# Altium schematic symbol library LUCHADOR SCHLIB.SchLib: 63 symbols
Pins are listed as number, name and electrical type; pins without a type are passive.

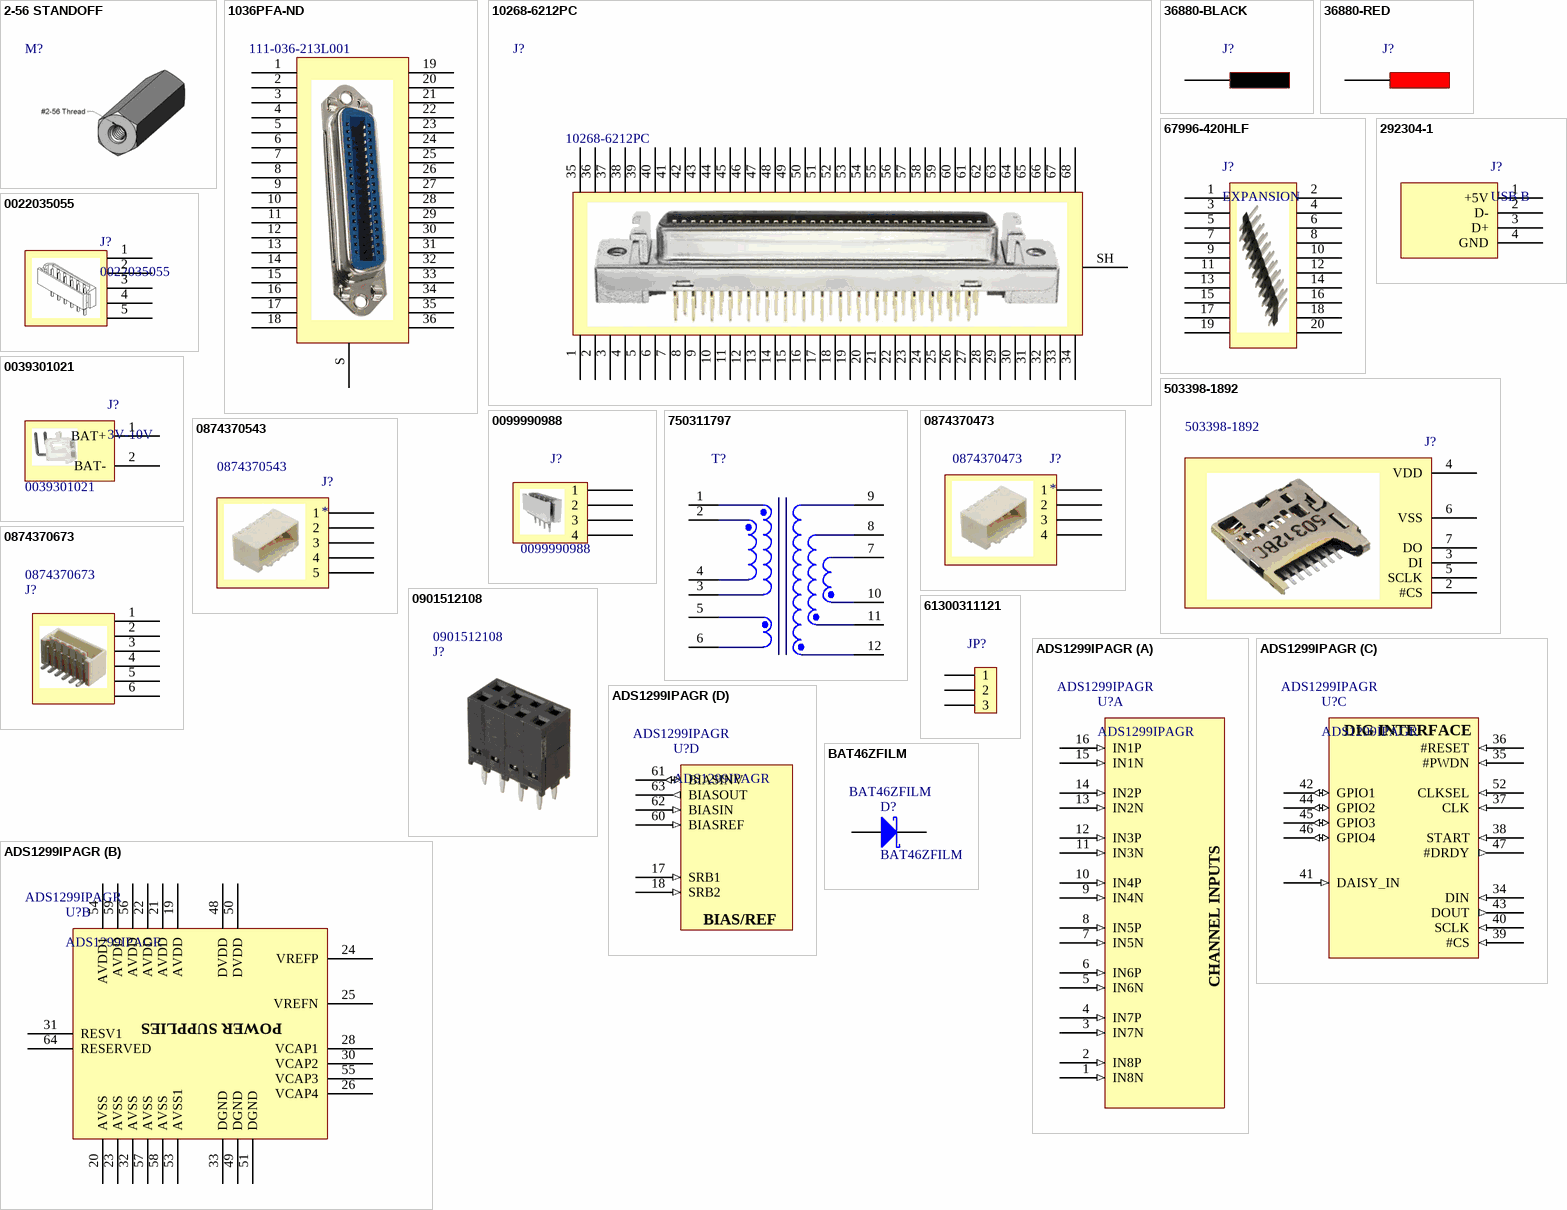
[diagram p0: symbols 2-56 STANDOFF to BAT46ZFILM]

## 2-56 STANDOFF
designator M?  (value not drawn)  (mechanical)
MANUFACTURER: MCMASTER-CARR; MANUFACTURER PART NUMBER: 91780A111; DESCRIPTION1: ALUMINUM STANDOFF, 5/8, 2-56; SUPPLIER 1: MCMASTER-CARR; SUPPLIER PART NUMBER 1: 91780A111

## 1036PFA-ND
designator J?  Manufacturer Part Number: 111-036-213L001  (hidden comment: *)
Manufacturer: NorComp Inc.; Description1: CONN SCSI .085" FEMALE PCB 36POS; Connector Style: Outer Shroud Contacts; Connector Type: Receptacle; Number of Positions: 36; Flange Feature: Hollow, Unthreaded; Supplier 1: Digi-Key; Supplier Part Number 1: 1036PFA-ND; RoHS: RoHS Compliant; Category: Connectors, Interconnects; Stock 1: 330; Pricing 1: 1=5.03, 10=4.824, 25=4.422, 50=4.221, 100=4.02, 250=3.51752, 500=3.417, 1000=2.9145, 2500=2.7135 (USD); Part Status: Active; Mounting Type: Through Hole; Termination: Solder; Type: SCSI; Features: Bail Lock; Contact Finish: Gold; Contact Finish Thickness: Flash; ComponentLink1URL: https://www.norcomp.net/rohspdfs/SCSI-050Ribbon/11Y/111/111-YYY-213L001.pdf; ComponentLink1Description: https://www.norcomp.net/rohspdfs/SCSI-050Ribbon/11Y/111/111-YYY-213L001.pdf
footprint 1036PFA-ND (Footprint not found)
pins: 1, 2, 3, 4, 5, 6, 7, 8, 9, 10, 11, 12, 13, 14, 15, 16, 17, 18, 19, 20, 21, 22, 23, 24, 25, 26, 27, 28, 29, 30, 31, 32, 33, 34, 35, 36, S

## 10268-6212PC
designator J?  Manufacturer Part Number: 10268-6212PC  (hidden comment: *)
Manufacturer: 3M; Description1: CONN MDR RECPT 68POS VERT T/H; Other Related Documents: MDR Selection Guide; Product Training Modules: Input/Output Connector Systems Primer Mini Delta Ribbon Connector System; Catalog Drawings: 102xx-6212PC Series; Featured Product: MDR Connectors; Connector Style: Outer Shroud Contacts; Connector Type: Receptacle; Number of Positions: 68; Flange Feature: Insert, Threaded (M2.5); Latchblocks; Online Catalog: 102, Mini D Ribbon (MDR) Series; Mating Products: MPB68A-ND / - CONN MDR PLUG 68POS IDC GOLD / 10168-8000EE-ND / - CONN MINI-D 68POS IDC PLUG; Other Names: 10268-6212PC-ND / 102686212PC / 3M1829 / 4547452261932 / 54745226193 / JE150317731; Supplier 1: Digi-Key; Supplier Part Number 1: 3M1829-ND; Stock 1: 647; Pricing 1: 1=8.67, 10=8.29, 25=7.536, 50=7.1592, 100=6.9708, 250=6.2172, 500=5.8404, 1000=5.1622 (USD); Standard Package: 100; Category: Connectors, Interconnects; Family: D-Shaped Connectors - Centronics; Series: 102, Mini D Ribbon (MDR); Number of Rows: 2; Mounting Type: Panel Mount, Through Hole; Termination: Solder; Features: Shielded; Contact Finish: Gold; Contact Finish Thickness: 30µin (0.76µm); ComponentLink1URL: https://datasheet.ciiva.com/16651/ts0427-16651753.pdf; ComponentLink1Description: https://datasheet.ciiva.com/16651/ts0427-16651753.pdf; ComponentLink2URL: https://datasheet.ciiva.com/16914/70114252-16914425.pdf; ComponentLink2Description: https://datasheet.ciiva.com/16914/70114252-16914425.pdf; ComponentLink3URL: https://datasheet.ciiva.com/1098/28339-1098010.pdf; ComponentLink3Description: https://datasheet.ciiva.com/1098/28339-1098010.pdf; ComponentLink4URL: https://datasheet.ciiva.com/650/ts0427-650527.pdf; ComponentLink4Description: https://datasheet.ciiva.com/650/ts0427-650527.pdf
footprint 10268-6212PC (Footprint not found)
pins: 1, 2, 3, 4, 5, 6, 7, 8, 9, 10, 11, 12, 13, 14, 15, 16, 17, 18, 19, 20, 21, 22, 23, 24, 25, 26, 27, 28, 29, 30, 31, 32, 33, 34, 35, 36, 37, 38, 39, 40, 41, 42, 43, 44, 45, 46, 47, 48, 49, 50, 51, 52, 53, 54, 55, 56, 57, 58, 59, 60, 61, 62, 63, 64, 65, 66, 67, 68, SH

## 36880-BLACK
designator J?  (value not drawn)
Manufacturer: PLASTIC1; Manufacturer Part Number: 36880-BLACK; Description1: DIN 42-802 PCB JACK, BLACK; Supplier 1: PLASTIC1; Supplier Part Number 1: 36880-BLACK; ComponentLink1URL: http://www.molex.com/pdm_docs/sd/039301021_sd.pdf; ComponentLink1Description: http://www.molex.com/pdm_docs/sd/039301021_sd.pdf
footprint DIN42082-BLACK (Footprint not found)
pins: 1

## 36880-RED
designator J?  (value not drawn)
Manufacturer: PLASTIC1; Manufacturer Part Number: 36880-RED; Description1: DIN 42-802 PCB JACK, RED; Supplier 1: PLASTIC1; Supplier Part Number 1: 36880-RED; ComponentLink1URL: http://www.molex.com/pdm_docs/sd/039301021_sd.pdf; ComponentLink1Description: http://www.molex.com/pdm_docs/sd/039301021_sd.pdf
footprint DIN42082-RED (Footprint not found)
pins: 1

## 67996-420HLF
designator J?, comment EXPANSION
Manufacturer: Amphenol FCI; Manufacturer Part Number: 67996-420HLF; Description1: CONN HEADER 20POS .100 STR TIN; Connector Type: Header, Unshrouded; Number of Positions: 20; Number of Positions Loaded: All; Pitch: 0.100" (2.54mm); Supplier 1: Digi-Key; Supplier Part Number 1: 609-3221-ND; RoHS: RoHS Compliant; Category: Connectors, Interconnects; Stock 1: 11616; Pricing 1: 1=0.68, 10=0.641, 25=0.5768, 100=0.4913, 250=0.44856, 500=0.4272, 1000=0.35244, 2500=0.3204, 5000=0.30972 (USD); Packaging: Bulk; Part Status: Active; Contact Type: Male Pin; Number of Rows: 2; Row Spacing: 0.100" (2.54mm); Contact Mating Length: 0.230" (5.84mm); Mounting Type: Through Hole; Termination: Solder; Fastening Type: -; Features: -; Contact Finish: Tin; Contact Finish Thickness: 100µin (2.54µm); Color: Black; ComponentLink1URL: http://portal.fciconnect.com/Comergent//fci/drawing/67996.pdf; ComponentLink1Description: http://portal.fciconnect.com/Comergent//fci/drawing/67996.pdf
footprint HEADER 10X2 (Footprint not found)
pins: 1, 2, 3, 4, 5, 6, 7, 8, 9, 10, 11, 12, 13, 14, 15, 16, 17, 18, 19, 20

## 292304-1
designator J?, comment USB B
Manufacturer: TE Connectivity AMP Connectors; Manufacturer Part Number: 292304-1; Description1: CONN USB RECEPT R/A TYPE B 4POS; Connector Type: USB - B; Number of Contacts: 4; Gender: Receptacle; Specifications: USB 2.0; Number of Ports: 1; Current Rating: 1A per Contact; Voltage - Rated: 30VAC; Mating Cycles: 1500; Shielding: Shielded; Material Flammability Rating: UL94 V-0; Supplier 1: Digi-Key; Supplier Part Number 1: A31725-ND; RoHS: RoHS Compliant; Category: Connectors, Interconnects; Stock 1: 27903; Pricing 1: 1=1.52, 10=1.377, 25=1.2924, 50=1.2362, 100=1.1799, 250=1.06756, 500=0.98328, 1000=0.8428, 2500=0.78662 (USD); Packaging: Tray; Part Status: Active; Mounting Type: Through Hole, Right Angle; Mounting Feature: Horizontal; Termination: Solder; Features: Board Lock; Ingress Protection: -; Operating Temperature: -55°C ~ 85°C; Contact Finish: Gold or Gold-Palladium; Shell/Shielding Material: Copper Alloy; Insulation Color: Black; ComponentLink1URL: http://www.te.com/commerce/DocumentDelivery/DDEController?Action=srchrtrv&DocNm=292304&DocType=Customer+Drawing&DocLang=English; ComponentLink1Description: http://www.te.com/commerce/DocumentDelivery/DDEController?Action=srchrtrv&DocNm=292304&DocType=Customer+Drawing&DocLang=English
footprint 292304-1 (Footprint not found)
pins: 1 +5V, 2 D-, 3 D+, 4 GND

## 503398-1892
designator J?  Manufacturer Part Number: 503398-1892  (hidden comment: *)
Manufacturer: Molex; Description1: Conn Micro SD Card SKT 8 POS 1.1mm Solder RA SMD 0.5A/Contact Embossed T/R; Current Rating: 500 mA; Voltage Rating: 10 VAC/DC; Supplier 1: Digi-Key; Supplier Part Number 1: WM11190CT-ND; Stock 1: 31833; Pricing 1: 1=2.53, 10=2.292, 25=2.1516, 50=2.0582, 100=1.9647, 250=1.7776, 500=1.6372, 1000=1.4033 (USD); Product Category: Memory Card Connectors; RoHS: Details; Brand: Molex; Packaging: Reel; Series: 503398; Factory Pack Quantity: 2400; ComponentLink1URL: https://datasheet.ciiva.com/23941/1740947-23941665.pdf; ComponentLink1Description: https://datasheet.ciiva.com/23941/1740947-23941665.pdf; ComponentLink2URL: https://datasheet.ciiva.com/16655/5033981892-memory-card-socket-16655604.pdf; ComponentLink2Description: https://datasheet.ciiva.com/16655/5033981892-memory-card-socket-16655604.pdf; ComponentLink3URL: https://datasheet.ciiva.com/29723/5033981892-sd-29723401.pdf; ComponentLink3Description: https://datasheet.ciiva.com/29723/5033981892-sd-29723401.pdf; ComponentLink4URL: https://datasheet.ciiva.com/22744/1740946-22744573.pdf; ComponentLink4Description: https://datasheet.ciiva.com/22744/1740946-22744573.pdf
footprint 503398-1892 (Footprint not found)
pins: 2 #CS, 3 DI, 4 VDD, 5 SCLK, 6 VSS, 7 DO

## 0022035055
designator J?
Manufacturer: Molex, LLC; Description1: CONN HEADER 5POS 2.5MM VERT TIN; Connector Type: Header; Pitch - Mating: 0.098" (2.50mm); Number of Positions: 5; Number of Positions Loaded: All; Style: Board to Cable/Wire; Shrouding: Shrouded - 4 Wall; Contact Length - Mating: 0.138" (3.50mm); Overall Contact Length: 0.350" (8.89mm); Material Flammability Rating: UL94 V-0; Supplier 1: Digi-Key; Supplier Part Number 1: WM18889-ND; Manufacturer Part Number: 0022035055; RoHS: RoHS Compliant; Category: Connectors, Interconnects; Stock 1: 17518; Pricing 1: 1=0.71, 10=0.665, 50=0.5324, 100=0.5101, 250=0.4658, 500=0.4436, 1000=0.36597, 2500=0.3327, 5000=0.32161 (USD); Packaging: Bulk; Part Status: Active; Contact Type: Male Pin; Number of Rows: 1; Row Spacing - Mating: -; Mounting Type: Through Hole; Termination: Solder; Fastening Type: Detent Lock; Contact Length - Post: 0.138" (3.50mm); Insulation Height: 0.232" (5.90mm); Contact Shape: Circular; Contact Finish - Mating: Tin; Contact Finish Thickness - Mating: -; Contact Finish - Post: Tin; Contact Material: Brass; Insulation Material: Polyamide (PA66), Nylon 6/6, Glass Filled; Features: -; Operating Temperature: -; Ingress Protection: -; Insulation Color: -; Current Rating: -; Voltage Rating: -; Mated Stacking Heights: -; Contact Finish Thickness - Post: -; Applications: Automotive, General Purpose, Industrial, Medical, Telecommunications; ComponentLink1URL: http://www.molex.com/pdm_docs/sd/022035055_sd.pdf; ComponentLink1Description: http://www.molex.com/pdm_docs/sd/022035055_sd.pdf
footprint 0022035055 (Footprint not found)
pins: 1, 2, 3, 4, 5

## 0039301021
designator J?, comment 3V-10V  Manufacturer Part Number: 0039301021
Manufacturer: Molex, LLC; Description1: CONN HEADER 2POS 4.2MM R/A GOLD; Connector Type: Header, Shrouded; Number of Positions: 2; Number of Positions Loaded: All; Row Spacing: 0.165" (4.20mm); Supplier 1: Digi-Key; Supplier Part Number 1: WM1363-ND; RoHS: RoHS Compliant; Category: Connectors, Interconnects; Stock 1: 5534; Pricing 1: 1=1.08, 10=0.952, 25=0.896, 50=0.8588, 100=0.8215, 250=0.7468, 500=0.67212, 1000=0.59744, 2500=0.54143 (USD); Packaging: Tray; Part Status: Active; Contact Type: Male Pin; Pitch: -; Number of Rows: 2; Contact Mating Length: -; Mounting Type: Through Hole, Right Angle; Termination: Solder; Fastening Type: Locking Ramp; Features: Board Lock; Contact Finish: Gold; Contact Finish Thickness: 30µin (0.76µm); Color: Natural; ComponentLink1URL: http://www.molex.com/pdm_docs/sd/039301021_sd.pdf; ComponentLink1Description: http://www.molex.com/pdm_docs/sd/039301021_sd.pdf
footprint 0039301021 (Footprint not found)
pins: 1 BAT+ (power), 2 BAT- (power)

## 0099990988
designator J?  Manufacturer Part Number: 0099990988  (hidden comment: *)
Manufacturer: Molex; Description1: 4 Positions Header, Shrouded Connector 0.098" (2.50mm) Through Hole Tin; Pitch: 2.5 mm; Number of Contacts: 4; Gender: HDR; Supplier 1: Digi-Key; Supplier Part Number 1: WM2890-ND; Stock 1: 20906; Pricing 1: 1=0.69, 10=0.644, 100=0.494, 500=0.4296, 1000=0.3544, 5000=0.3115, 10000=0.29 (USD); Type: Wire to Board; Number of Rows: 1; Contact Plating: Tin Over Copper; Termination Method: Solder; Category: Connector Headers and PCB Receptacles; ComponentLink1URL: https://datasheet.ciiva.com/738/099990989-sd-738043.pdf; ComponentLink1Description: https://datasheet.ciiva.com/738/099990989-sd-738043.pdf; ComponentLink2URL: https://datasheet.ciiva.com/10088/0099990988-pcb-headers-10088119.pdf; ComponentLink2Description: https://datasheet.ciiva.com/10088/0099990988-pcb-headers-10088119.pdf; ComponentLink3URL: https://datasheet.ciiva.com/16724/0099990988-pcb-headers-16724880.pdf; ComponentLink3Description: https://datasheet.ciiva.com/16724/0099990988-pcb-headers-16724880.pdf
footprint 0099990988 (Footprint not found)
pins: 1, 2, 3, 4

## 750311797
designator T?  (value not drawn)
Manufacturer: Wurth Electronics; Manufacturer Part Number: 750311797; Description1: WURTH ELEKTRONIK   750311797   Pulse Transformer, 2.5:1, 14 H, 0.055 ohm, 4 kV; Inductance: 14uh; Turns Ratio: 2.5:1; DC Resistance (DCR): 55mR; Isolation Voltage: 4kV; Input Current: 3A; Supplier 1: Digi-Key; Supplier Part Number 1: 732-2658-6-ND; Stock 1: 2336; Pricing 1: 1=12.38, 10=11.592, 50=11.088 (USD); Mount: Surface Mount; Min Operating Temperature: -40°C; Max Operating Temperature: 125°C; Package Quantity: 1; Packaging: Tape and Reel; Length: 29.08mm; Width: 23.11mm; Height - Seated (Max): 11.43mm; Depth: 11.43mm; REACH SVHC: Unknown; ComponentLink1URL: https://datasheet.ciiva.com/1431/750311797-1431378.pdf; ComponentLink1Description: https://datasheet.ciiva.com/1431/750311797-1431378.pdf; ComponentLink2URL: https://datasheet.ciiva.com/1379/1736750-1379471.pdf; ComponentLink2Description: https://datasheet.ciiva.com/1379/1736750-1379471.pdf; ComponentLink3URL: https://datasheet.ciiva.com/25622/0900766b810a6c7e-25622767.pdf; ComponentLink3Description: https://datasheet.ciiva.com/25622/0900766b810a6c7e-25622767.pdf
footprint 750311797 (Footprint not found)
pins: 1, 2, 3, 4, 5, 6, 7, 8, 9, 10, 11, 12

## 0874370473
designator J?  Manufacturer Part Number: 0874370473
Manufacturer: Molex; Description1: 4 Positions Header, Shrouded Connector 0.059" (1.50mm) Surface Mount; Connector Type: Header, Shrouded; Number of Positions: 4; Number of Positions Loaded: All; Pitch: 0.059" (1.50mm); Supplier 1: Digi-Key; Supplier Part Number 1: WM3969CT-ND; Stock 1: 47726; Pricing 1: 1=1.04, 10=0.911, 100=0.7863 (USD); Category: Connectors, Interconnects; Family: Rectangular Connectors - Headers, Male Pins; Series: Pico-SPOX™ 87437; Packaging: Cut Tape (CT); Contact Type: Male Pin; Number of Rows: 1; Row Spacing: -; Contact Mating Length: 0.106" (2.70mm); Mounting Type: Surface Mount; Termination: Solder; Fastening Type: -; Features: Pick and Place Cap; Contact Finish: -; Contact Finish Thickness: -; Color: Beige; ComponentLink1URL: https://datasheet.ciiva.com/30013/874370473-sd-30013186.pdf; ComponentLink1Description: https://datasheet.ciiva.com/30013/874370473-sd-30013186.pdf; ComponentLink2URL: https://datasheet.ciiva.com/738/874370473-sd-738357.pdf; ComponentLink2Description: https://datasheet.ciiva.com/738/874370473-sd-738357.pdf; ComponentLink3URL: https://datasheet.ciiva.com/738/874370473-sd-738377.pdf; ComponentLink3Description: https://datasheet.ciiva.com/738/874370473-sd-738377.pdf
footprint 0874370473 (Footprint not found)
pins: 1, 2, 3, 4

## 0874370543
designator J?  Manufacturer Part Number: 0874370543
Manufacturer: Molex; Description1: 5 Positions Header, Shrouded Connector 0.059" (1.50mm) Surface Mount Tin; Rad Hard: No; Pitch: 1.5 mm; Number of Contacts: 5; Gender: HDR; Supplier 1: Digi-Key; Supplier Part Number 1: WM18584CT-ND; Stock 1: 14681; Pricing 1: 1=0.89, 10=0.784, 100=0.6761, 500=0.5532 (USD); Packaging: Cut Tape; Type: Shrouded Header; Number of Rows: 1; Contact Plating: Tin Over Nickel; Termination Method: Solder; Category: Connector Headers and PCB Receptacles; ComponentLink1URL: https://datasheet.ciiva.com/6813/874370443-sd-6813714.pdf; ComponentLink1Description: https://datasheet.ciiva.com/6813/874370443-sd-6813714.pdf; ComponentLink2URL: https://datasheet.ciiva.com/9469/0874370543-pcb-headers-9469971.pdf; ComponentLink2Description: https://datasheet.ciiva.com/9469/0874370543-pcb-headers-9469971.pdf; ComponentLink3URL: https://datasheet.ciiva.com/10084/0874370543-pcb-headers-10084743.pdf; ComponentLink3Description: https://datasheet.ciiva.com/10084/0874370543-pcb-headers-10084743.pdf; ComponentLink4URL: https://datasheet.ciiva.com/6832/874370543-sd-6832283.pdf; ComponentLink4Description: https://datasheet.ciiva.com/6832/874370543-sd-6832283.pdf
footprint 0874370543 (Footprint not found)
pins: 1, 2, 3, 4, 5

## 0874370673
designator J?  Manufacturer Part Number: 0874370673  (hidden comment: *)
Manufacturer: Molex; Description1: Conn Shrouded Header HDR 6 POS 1.5mm Solder ST SMD Embossed T/R; Pitch: 1.5 mm; Number of Contacts: 6; Gender: HDR; Supplier 1: Digi-Key; Supplier Part Number 1: WM7141CT-ND; Stock 1: 9106; Pricing 1: 1=1.29, 10=1.131, 100=0.976 (USD); Type: Shrouded Header; Number of Rows: 1; Contact Plating: Tin Over Nickel; Termination Method: Solder; Category: Connector Headers and PCB Receptacles
footprint 0874370673 (Footprint not found)
pins: 1, 2, 3, 4, 5, 6

## 0901512108
designator J?  Manufacturer Part Number: 0901512108  (hidden comment: *)
Manufacturer: Molex, LLC; Description1: CONN 8POS DUAL VERT TIN PCB; Connector Type: Receptacle; Number of Positions: 8; Number of Positions Loaded: All; Pitch: 0.100" (2.54mm); Supplier 1: Digi-Key; Supplier Part Number 1: WM14836-ND; RoHS: RoHS Compliant; Category: Connectors, Interconnects; Stock 1: 2080; Pricing 1: 1=4.37, 10=4.197, 50=3.6722, 100=3.4974, 250=3.06024, 500=2.9728, 1000=2.53562, 2500=2.36074, 5000=2.27331 (USD); Packaging: Tube; Part Status: Active; Contact Type: Female Socket; Number of Rows: 2; Row Spacing: 0.100" (2.54mm); Mounting Type: Through Hole; Termination: Solder; Fastening Type: -; Features: -; Contact Finish: Tin; Contact Finish Thickness: 40µin (1.02µm); Color: Black; ComponentLink1URL: http://www.molex.com/pdm_docs/sd/901512106_sd.pdf; ComponentLink1Description: http://www.molex.com/pdm_docs/sd/901512106_sd.pdf

## 61300311121
designator JP?  (value not drawn)
Manufacturer: Wurth Electronics Inc.; Manufacturer Part Number: 61300311121; Description1: CONN HEADER 3 POS 2.54; Connector Type: Header; Pitch - Mating: 0.100" (2.54mm); Number of Positions: 3; Number of Positions Loaded: All; Style: Board to Board or Cable; Shrouding: Unshrouded; Contact Length - Mating: 0.236" (6.00mm); Contact Length - Post: 0.118" (3.00mm); Overall Contact Length: 0.454" (11.54mm); Material Flammability Rating: UL94 V-0; Current Rating: 3A; Voltage Rating: 250V; Supplier 1: Digi-Key; Supplier Part Number 1: 732-5316-ND; RoHS: RoHS Compliant; Category: Connectors, Interconnects; Stock 1: 121479; Pricing 1: 1=0.13, 10=0.106, 25=0.088, 50=0.074, 100=0.067, 1000=0.061 (USD); Packaging: Bulk; Part Status: Active; Contact Type: Male Pin; Number of Rows: 1; Row Spacing - Mating: -; Mounting Type: Through Hole; Termination: Solder; Fastening Type: Push-Pull; Insulation Height: 0.100" (2.54mm); Contact Shape: Square; Contact Finish - Mating: Gold; Contact Finish Thickness - Mating: -; Contact Finish - Post: -; Contact Material: Copper Alloy; Insulation Material: Polybutylene Terephthalate (PBT); Features: -; Operating Temperature: -40°C ~ 125°C; Ingress Protection: -; Insulation Color: Black; Mated Stacking Heights: -; Contact Finish Thickness - Post: -; Applications: -; ComponentLink1URL: http://katalog.we-online.de/em/datasheet/6130xx11121.pdf; ComponentLink1Description: http://katalog.we-online.de/em/datasheet/6130xx11121.pdf
footprint 61300311121 (Footprint not found)
pins: 1, 2, 3

## ADS1299IPAGR
designator U?
Manufacturer: Texas Instruments; Description1: IC AFE 24BIT 16KSPS LN 64TQFP; Number of Bits: 24; Number of Channels: 8; Power (Watts): 42mW; Voltage - Supply, Analog: 5V; Voltage - Supply, Digital: 1.8 V ~ 3.6 V; Supplier 1: Digi-Key; Supplier Part Number 1: 296-34818-1-ND; RoHS: RoHS Compliant; Category: Integrated Circuits (ICs); Stock 1: 1324; Pricing 1: 1=55.08, 10=51.84, 100=46.332, 500=43.416, 1000=40.5 (USD); Packaging: Cut Tape (CT); Part Status: Active; Package / Case: 64-TQFP; Supplier Device Package: 64-TQFP (10x10); ComponentLink1URL: http://www.ti.com/lit/ds/symlink/ads1299.pdf; ComponentLink1Description: http://www.ti.com/lit/ds/symlink/ads1299.pdf; Manufacturer Part Number: ADS1299IPAGR
footprint TQFP-64 (Footprint not found)
part A pins: 1 IN8N (in), 2 IN8P (in), 3 IN7N (in), 4 IN7P (in), 5 IN6N (in), 6 IN6P (in), 7 IN5N (in), 8 IN5P (in), 9 IN4N (in), 10 IN4P (in), 11 IN3N (in), 12 IN3P (in), 13 IN2N (in), 14 IN2P (in), 15 IN1N (in), 16 IN1P (in)
part B pins: 19 AVDD (power), 20 AVSS (power), 21 AVDD (power), 22 AVDD (power), 23 AVSS (power), 24 VREFP, 25 VREFN, 26 VCAP4, 28 VCAP1, 30 VCAP2, 31 RESV1, 32 AVSS (power), 33 DGND (power), 48 DVDD (power), 49 DGND (power), 50 DVDD (power), 51 DGND (power), 53 AVSS1 (power), 54 AVDD1 (power), 55 VCAP3, 56 AVDD (power), 57 AVSS (power), 58 AVSS (power), 59 AVDD (power), 64 RESERVED
part C pins: 34 DIN (in), 35 #PWDN (in), 36 #RESET (in), 37 CLK (in), 38 START (in), 39 #CS (in), 40 SCLK (in), 41 DAISY_IN (in), 42 GPIO1 (io), 43 DOUT (out), 44 GPIO2 (io), 45 GPIO3 (io), 46 GPIO4 (io), 47 #DRDY (out), 52 CLKSEL (in)
part D pins: 17 SRB1 (in), 18 SRB2 (in), 60 BIASREF (in), 61 BIASINV (io), 62 BIASIN (in), 63 BIASOUT (out)
part A text: CHANNEL INPUTS
part B text: POWER SUPPLIES
part C text: DIG INTERFACE
part D text: BIAS/REF

## BAT46ZFILM
designator D?
Schottky Rectifier; Manufacturer: STMicroelectronics; Description1: DIODE SCHOTTKY 100V 150MA SOD123; Voltage - DC Reverse (Vr) (Max): 100V; Current - Average Rectified (Io): 150mA (DC); Voltage - Forward (Vf) (Max) @ If: 1V @ 250mA; Speed: Small Signal =< 200mA (Io), Any Speed; Current - Reverse Leakage @ Vr: 5µA @ 75V; Capacitance @ Vr, F: 10pF @ 0V, 1MHz; Supplier 1: Digi-Key; Supplier Part Number 1: 497-5559-6-ND; RoHS: RoHS Compliant; Category: Discrete Semiconductor Products; Stock 1: 71281; Pricing 1: 1=0.34, 10=0.277, 100=0.1468, 500=0.0965, 1000=0.06575 (USD); Packaging: Digi-Reel®; Part Status: Active; Diode Type: Schottky; Reverse Recovery Time (trr): -; Mounting Type: Surface Mount; Package / Case: SOD-123; Supplier Device Package: SOD-123; Operating Temperature - Junction: 150°C (Max); ComponentLink1URL: http://www.st.com/content/ccc/resource/technical/document/datasheet/c6/32/d4/4a/28/d3/4b/11/CD00004930.pdf/files/CD00004930.pdf/jcr:content/translations/en.CD00004930.pdf; ComponentLink1Description: http://www.st.com/content/ccc/resource/technical/document/datasheet/c6/32/d4/4a/28/d3/4b/11/CD00004930.pdf/files/CD00004930.pdf/jcr:content/translations/en.CD00004930.pdf; Manufacturer Part Number: BAT46ZFILM
footprint SOD-123 (Footprint not found)
pins: 1 A, 2 K

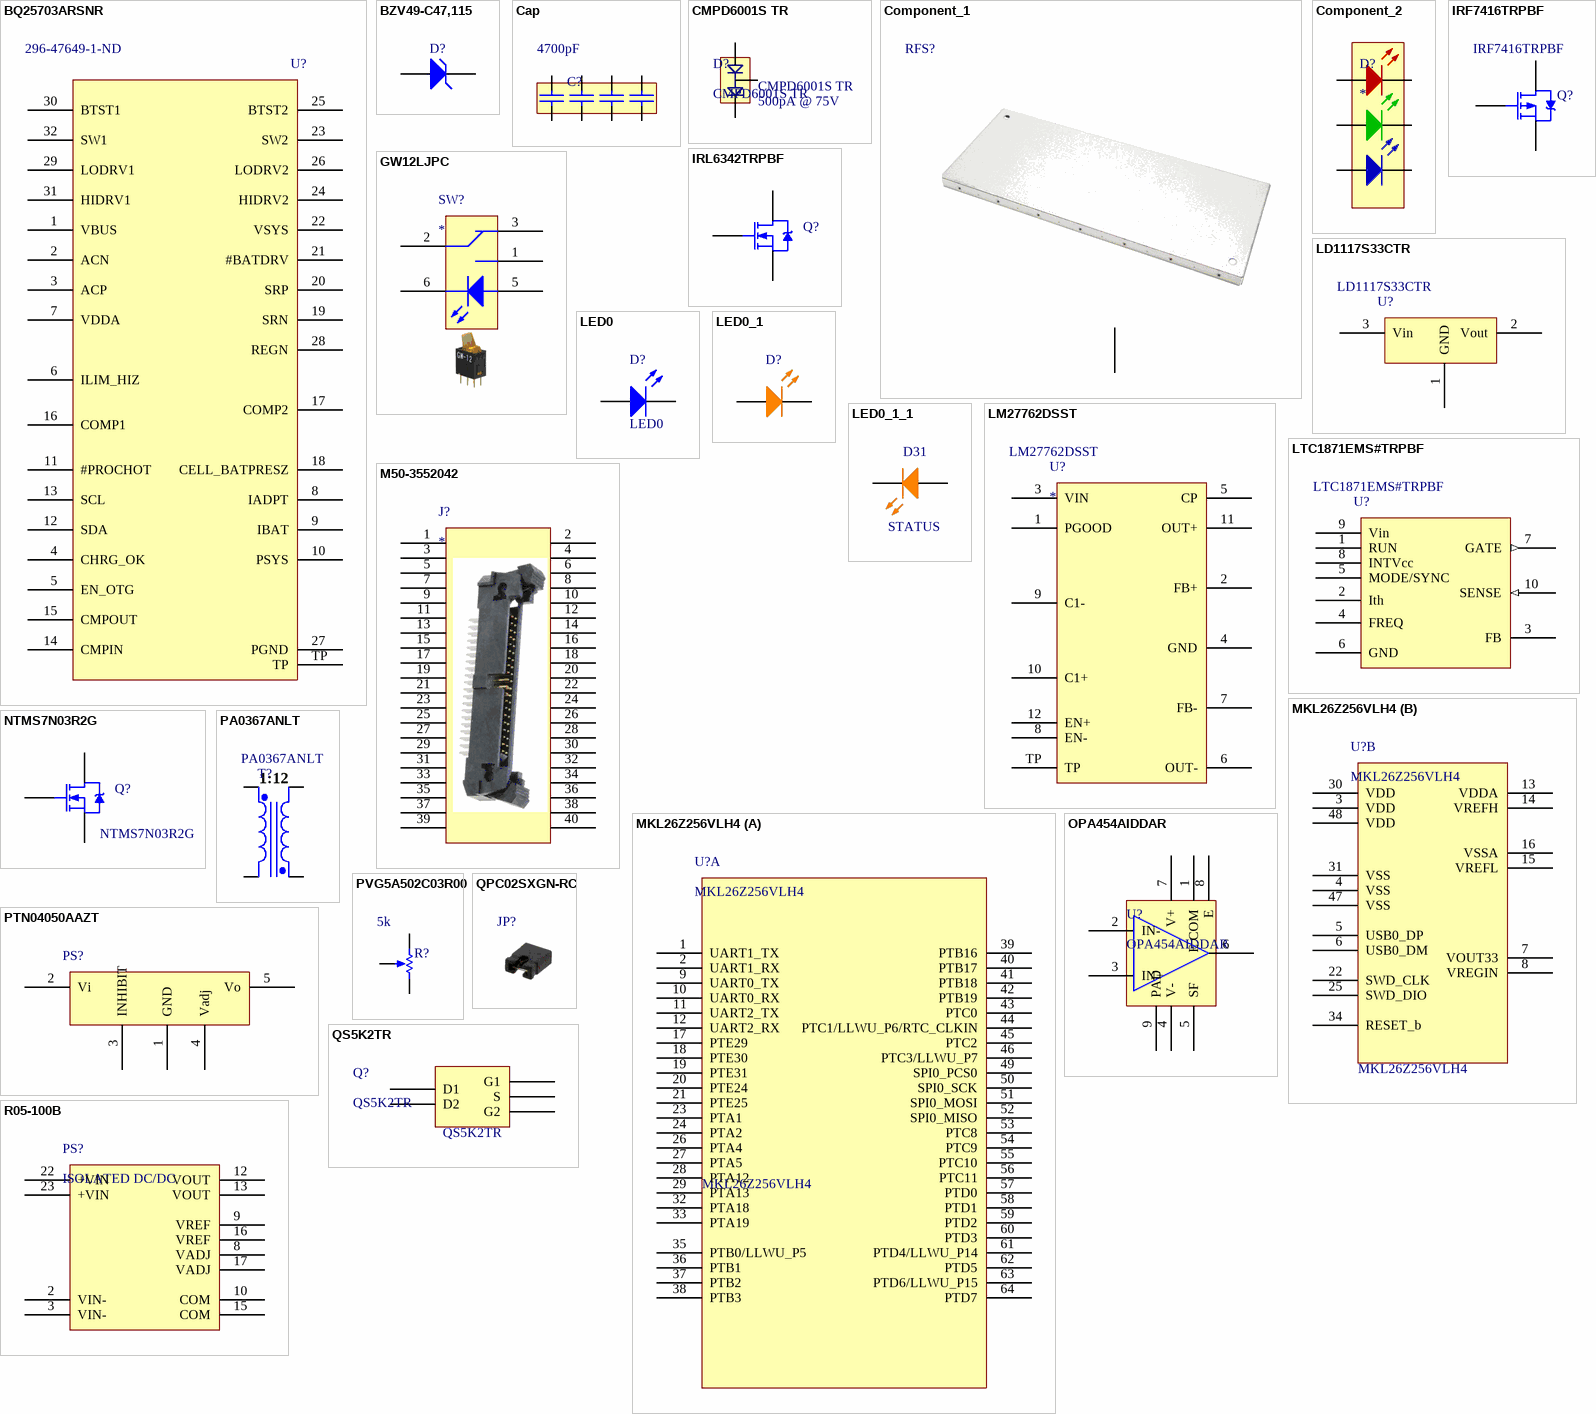
[diagram p1: symbols BQ25703ARSNR to R05-100B]

## BQ25703ARSNR
designator U?  Supplier Part Number 1: 296-47649-1-ND  (hidden comment: *)
Manufacturer: Texas Instruments; Manufacturer Part Number: BQ25703ARSNR; Supplier 1: Digi-Key; Stock 1: 2354; Pricing 1: 1=5.28, 10=4.746, 100=3.8885, 500=3.3102, 1000=2.7917 (USD); ComponentLink1URL: http://www.ti.com/lit/ds/symlink/bq25703a.pdf; ComponentLink1Description: http://www.ti.com/lit/ds/symlink/bq25703a.pdf
footprint WFQFN-32 (Footprint not found)
pins: 1 VBUS, 2 ACN, 3 ACP, 4 CHRG_OK, 5 EN_OTG, 6 ILIM_HIZ, 7 VDDA, 8 IADPT, 9 IBAT, 10 PSYS, 11 #PROCHOT, 12 SDA, 13 SCL, 14 CMPIN, 15 CMPOUT, 16 COMP1, 17 COMP2, 18 CELL_BATPRESZ, 19 SRN, 20 SRP, 21 #BATDRV, 22 VSYS, 23 SW2, 24 HIDRV2, 25 BTST2, 26 LODRV2, 27 PGND, 28 REGN, 29 LODRV1, 30 BTST1, 31 HIDRV1, 32 SW1, TP

## BZV49-C47,115
designator D?  (value not drawn)
Zener Diode; Manufacturer: NXP Semiconductors; Description1: DIODE ZENER 47V 1W SOT89; Voltage - Zener (Nom) (Vz): 47V; Tolerance: ±5%; Power - Max: 1W; Impedance (Max) (Zzt): 170 Ohm; Current - Reverse Leakage @ Vr: 50nA @ 32.9V; Voltage - Forward (Vf) (Max) @ If: 1V @ 50mA; Supplier 1: Digi-Key; Supplier Part Number 1: 568-7039-1-ND; Manufacturer Part Number: BZV49-C47,115; RoHS: RoHS Compliant; Category: Discrete Semiconductor Products; Stock 1: 1792; Pricing 1: 1=0.56, 10=0.481, 100=0.3589, 500=0.28194 (USD); Packaging: Cut Tape (CT); Part Status: Active; Operating Temperature: -65°C ~ 150°C; Mounting Type: Surface Mount; Package / Case: TO-243AA; Supplier Device Package: SOT-89-3; ComponentLink1URL: http://www.nxp.com/documents/data_sheet/BZV49_SERIES.pdf; ComponentLink1Description: http://www.nxp.com/documents/data_sheet/BZV49_SERIES.pdf
footprint SOT-89 (Footprint not found)
pins: 1 A, 2 K

## Cap
designator C?, comment Capacitance: 4700pF  (hidden comment: 50V)
CAP .1UF 50V CERAMIC Y5V 0805; Manufacturer: TDK; PCN Part Number: MLCC Part Number Change 30/Nov/2012; Manufacturer Part Number: CKCA43X7R1H472M100AA; Description1: Cap Ceramic Array 0.0047uF 50V X7R 20% 1206 SMD 4 Capacitor 125C Plastic T/R; Product Training Modules: CKC Series Array Capacitor Family; Catalog Drawings: CKC 1206 Series CKC 1206 Series Footprint; Featured Product: CKC Series; Tolerance: ±20%; Number of Capacitors: 4; Circuit Type: Isolated; Temperature Coefficient: X7R; Other Names: 445-1853-1; Revision: July-2002: Re-released for DXP Platform.; Supplier 1: Digi-Key; Supplier Part Number 1: 445-1853-1-ND; Stock 1: 155348; Pricing 1: 1=0.33, 10=0.228, 100=0.129, 500=0.0911, 1000=0.0797 (USD); RoHS Information: RoHS Certificate-MLCC; Standard Package: 1; Category: Capacitors; Family: Capacitor Arrays; Series: CKC; Packaging: Cut Tape (CT); Voltage - Rated: 50V; Dielectric Material: Ceramic; Mounting Type: Surface Mount; Package / Case: 1206 (3216 Metric); Size / Dimension: 0.126" L x 0.063" W (3.20mm x 1.60mm); Height - Seated (Max): 0.051" (1.30mm); Ratings: -; Online Catalog: CKC Series; ComponentLink1URL: https://datasheet.ciiva.com/7615/mlccspec-commercial-array-en-7615142.pdf; ComponentLink1Description: https://datasheet.ciiva.com/7615/mlccspec-commercial-array-en-7615142.pdf; ComponentLink2URL: https://datasheet.ciiva.com/7615/mlccspec-commercial-array-en-7615147.pdf; ComponentLink2Description: https://datasheet.ciiva.com/7615/mlccspec-commercial-array-en-7615147.pdf; ComponentLink3URL: https://datasheet.ciiva.com/7615/mlccspec-commercial-array-en-7615148.pdf; ComponentLink3Description: https://datasheet.ciiva.com/7615/mlccspec-commercial-array-en-7615148.pdf; ComponentLink4URL: https://datasheet.ciiva.com/24216/ckca43x7r1h472m100aa-266209-24216735.pdf; ComponentLink4Description: https://datasheet.ciiva.com/24216/ckca43x7r1h472m100aa-266209-24216735.pdf
footprint 1206C-ARRAY (Footprint not found)
pins: A1, A2, A3, A4, B1, B2, B3, B4

## CMPD6001S TR
designator D?  Current - Reverse Leakage @ Vr: 500pA @ 75V
Manufacturer: Central Semiconductor Corp; Description1: DIODE ARRAY GP 75V 250MA SOT23; Diode Configuration: 1 Pair Series Connection; Diode Type: Standard; Voltage - DC Reverse (Vr) (Max): 75V; Current - Average Rectified (Io) (per Diode): 250mA; Voltage - Forward (Vf) (Max) @ If: 1.1V @ 100mA; Speed: Fast Recovery =< 500ns, > 200mA (Io); Reverse Recovery Time (trr): 3µs; Supplier 1: Digi-Key; Supplier Part Number 1: CMPD6001S CT-ND; RoHS: RoHS Compliant; Category: Discrete Semiconductor Products; Stock 1: 7051; Pricing 1: 1=0.89, 10=0.872, 25=0.7868, 100=0.6885, 250=0.60376, 500=0.53548, 750=0.46717, 1000=0.42346 (USD); Packaging: Cut Tape (CT); Part Status: Active; Mounting Type: Surface Mount; Package / Case: TO-236-3, SC-59, SOT-23-3; Supplier Device Package: SOT-23; ComponentLink1URL: http://www.centralsemi.com/PDFs/products/CMPD6001-A-C-S_R1.PDF; ComponentLink1Description: http://www.centralsemi.com/PDFs/products/CMPD6001-A-C-S_R1.PDF; Manufacturer Part Number: CMPD6001S TR
pins: 1, 2, 3

## Component_1
designator RFS?  (value not drawn)
pins: 1

## Component_2
designator D?
Manufacturer: Broadcom Avago; Manufacturer Part Number: ASMB-TTB0-0A3A2; Description1: BROADCOM LIMITED   ASMB-TTB0-0A3A2   LED, RGB, Red, Green, Blue, R 790mcd, G 2.4cd, B 500mcd, 115 , R 2.1V, G 3.1V, B 3.1V; Color: Red, Green, Blue (RGB); Lens Transparency: Diffused; Millicandela Rating: 790mcd Red, 2400mcd Green, 500mcd Blue; Lens Style/Size: Round with Flat Top; Voltage - Forward (Vf) (Typ): 2.1V Red, 3.1V Green, 3.1V Blue; Current - Test: 20mA Red, 20mA Green, 20mA Blue; Viewing Angle: 115°; Wavelength - Dominant: 621nm Red, 530nm Green, 470nm Blue; Wavelength - Peak: 635nm Red, 521nm Green, 464nm Blue; Supplier 1: Digi-Key; Supplier Part Number 1: 516-3281-1-ND; Stock 1: 165716; Pricing 1: 1=1.57, 10=1.272, 25=0.9788, 100=0.8809, 250=0.783, 500=0.6656, 1000=0.5481 (USD); Category: Optoelectronics; Family: LED Indication - Discrete; Series: -; Packaging: Tape & Reel (TR); Lens Color: -; Mounting Type: Surface Mount; Features: -; Package / Case: 6-SMD, J-Lead; Supplier Device Package: 6-PLCC; Size / Dimension: 3.50mm L x 3.50mm W; Height (Max): 2.80mm
footprint ASMB-TTB0-0A3A2 (Footprint not found)
pins: 1 K, 2 K, 3 K, 4 A, 5 A, 6 A

## GW12LJPC
designator SW?
Manufacturer: NKK Switches; Manufacturer Part Number: GW12LJPC; Description1: SWITCH ROCKER SPDT 0.4VA 28V; Circuit: SPDT; Switch Function: On-On; Current Rating: 0.4VA (AC/DC); Voltage Rating - AC: 28V; Actuator Type: Paddle - Illuminated; Color - Actuator/Cap: Clear; Actuator Marking: No Marking; Illumination Type, Color: LED, Red; Illumination Voltage (Nominal): 2 VDC; Mechanical Life: 50,000 Cycles; Supplier 1: Digi-Key; Supplier Part Number 1: 360-2109-ND; RoHS: RoHS Compliant; Category: Switches; Stock 1: 78; Pricing 1: 1=5.71, 10=5.44, 50=4.896, 100=4.828, 250=4.692, 500=4.488, 1000=3.944, 5000=3.672 (USD); Packaging: Tray; Part Status: Active; Voltage Rating - DC: 28V; Mounting Type: Through Hole; Termination Style: PC Pin; Ingress Protection: -; Features: Sealed - Flux Protection; Panel Cutout Dimensions: -; Operating Temperature: -25°C ~ 55°C; Electrical Life: 50,000 Cycles; ComponentLink1URL: http://2t70un3m1d9z1kztamkdrd38.wpengine.netdna-cdn.com/wp-content/uploads/2016/03/gwillum.pdf; ComponentLink1Description: http://2t70un3m1d9z1kztamkdrd38.wpengine.netdna-cdn.com/wp-content/uploads/2016/03/gwillum.pdf
footprint GW12LJPC (Footprint not found)
pins: 1, 2, 3, 5 4, 6 5

## IRF7416TRPBF
designator Q?
P-Channel Power MOSFET; Manufacturer: Infineon Technologies; Description1: MOSFET P-CH 30V 10A 8-SOIC; FET Type: MOSFET P-Channel, Metal Oxide; FET Feature: Standard; Drain to Source Voltage (Vdss): 30V; Current - Continuous Drain (Id) @ 25°C: 10A (Ta); Rds On (Max) @ Id, Vgs: 20 mOhm @ 5.6A, 10V; Vgs(th) (Max) @ Id: 1V @ 250µA; Gate Charge (Qg) @ Vgs: 92nC @ 10V; Input Capacitance (Ciss) @ Vds: 1700pF @ 25V; Power - Max: 2.5W; Supplier 1: Digi-Key; Supplier Part Number 1: IRF7416TRPBFCT-ND; RoHS: RoHS Compliant; Category: Discrete Semiconductor Products; Stock 1: 11038; Pricing 1: 1=0.84, 10=0.751, 100=0.5851, 500=0.48338, 1000=0.38162 (USD); Packaging: Cut Tape (CT); Part Status: Active; Operating Temperature: -55°C ~ 150°C (TJ); Mounting Type: Surface Mount; Package / Case: 8-SOIC (0.154", 3.90mm Width); Supplier Device Package: 8-SO; ComponentLink1URL: http://www.irf.com/product-info/datasheets/data/irf7416pbf.pdf; ComponentLink1Description: http://www.irf.com/product-info/datasheets/data/irf7416pbf.pdf; Manufacturer Part Number: IRF7416TRPBF
footprint SOIC-8 (Footprint not found)
pins: 1 S, 2 S, 3 S, 4 G, 5 D, 6 D, 7 D, 8 D

## IRL6342TRPBF
designator Q?  (value not drawn)
HEXFET Power MOSFET; Manufacturer: Infineon Technologies; Description1: MOSFET N-CH 30V 9.9A 8SOIC; FET Type: MOSFET N-Channel, Metal Oxide; FET Feature: Standard; Drain to Source Voltage (Vdss): 30V; Current - Continuous Drain (Id) @ 25°C: 9.9A (Ta); Rds On (Max) @ Id, Vgs: 14.6 mOhm @ 9.9A, 4.5V; Vgs(th) (Max) @ Id: 1.1V @ 10µA; Gate Charge (Qg) @ Vgs: 11nC @ 4.5V; Input Capacitance (Ciss) @ Vds: 1025pF @ 25V; Power - Max: 2.5W; Supplier 1: Digi-Key; Supplier Part Number 1: IRL6342TRPBFCT-ND; Manufacturer Part Number: IRL6342TRPBF; RoHS: RoHS Compliant; Category: Discrete Semiconductor Products; Stock 1: 12997; Pricing 1: 1=0.57, 10=0.491, 100=0.3663, 500=0.28778, 1000=0.22238 (USD); Packaging: Cut Tape (CT); Part Status: Active; Operating Temperature: -55°C ~ 150°C (TJ); Mounting Type: Surface Mount; Package / Case: 8-SOIC (0.154", 3.90mm Width); Supplier Device Package: 8-SO; ComponentLink1URL: http://www.irf.com/product-info/datasheets/data/irl6342pbf.pdf; ComponentLink1Description: http://www.irf.com/product-info/datasheets/data/irl6342pbf.pdf
footprint SOIC-8 (Footprint not found)
pins: 1 S, 2 S, 3 S, 4 G, 5 D, 6 D, 7 D, 8 D

## LD1117S33CTR
designator U?
Manufacturer: STMicroelectronics; Description1: IC REG LDO 3.3V 0.8A SOT223; Regulator Topology: Positive Fixed; Voltage - Output: 3.3V; Current - Output: 800mA; Voltage - Dropout (Typical): 1.1V @ 800mA; Number of Regulators: 1; Voltage - Input: Up to 15V; Supplier 1: Digi-Key; Supplier Part Number 1: 497-1241-1-ND; RoHS: RoHS Compliant; Category: Integrated Circuits (ICs); Stock 1: 74769; Pricing 1: 1=0.46, 10=0.373, 100=0.2541, 500=0.1902, 1000=0.14245 (USD); Packaging: Cut Tape (CT); Part Status: Active; Current - Limit (Min): -; Operating Temperature: -40°C ~ 125°C; Mounting Type: Surface Mount; Package / Case: TO-261-4, TO-261AA; Supplier Device Package: SOT-223; ComponentLink1URL: http://www.st.com/web/en/resource/technical/document/datasheet/CD00000544.pdf; ComponentLink1Description: http://www.st.com/web/en/resource/technical/document/datasheet/CD00000544.pdf; Manufacturer Part Number: LD1117S33CTR
footprint SOT-223 (Footprint not found)
pins: 1 GND (power), 2 Vout (power), 3 Vin (power), 4 Vout (power)
